# Altium footprint library Pcb-hionyPcbLib.PcbLib: 580 footprints (part 4 of 37)
Each footprint in its own frame and in the unit in brackets; x right, y up, seen from the top. Pads: shape width x height; smd on the part's side, far side on the other; paste and mask are expansions set on the pad; w line width, h text height; cw(c..) or ccw(c..) is an arc to the next point about the centre after c.
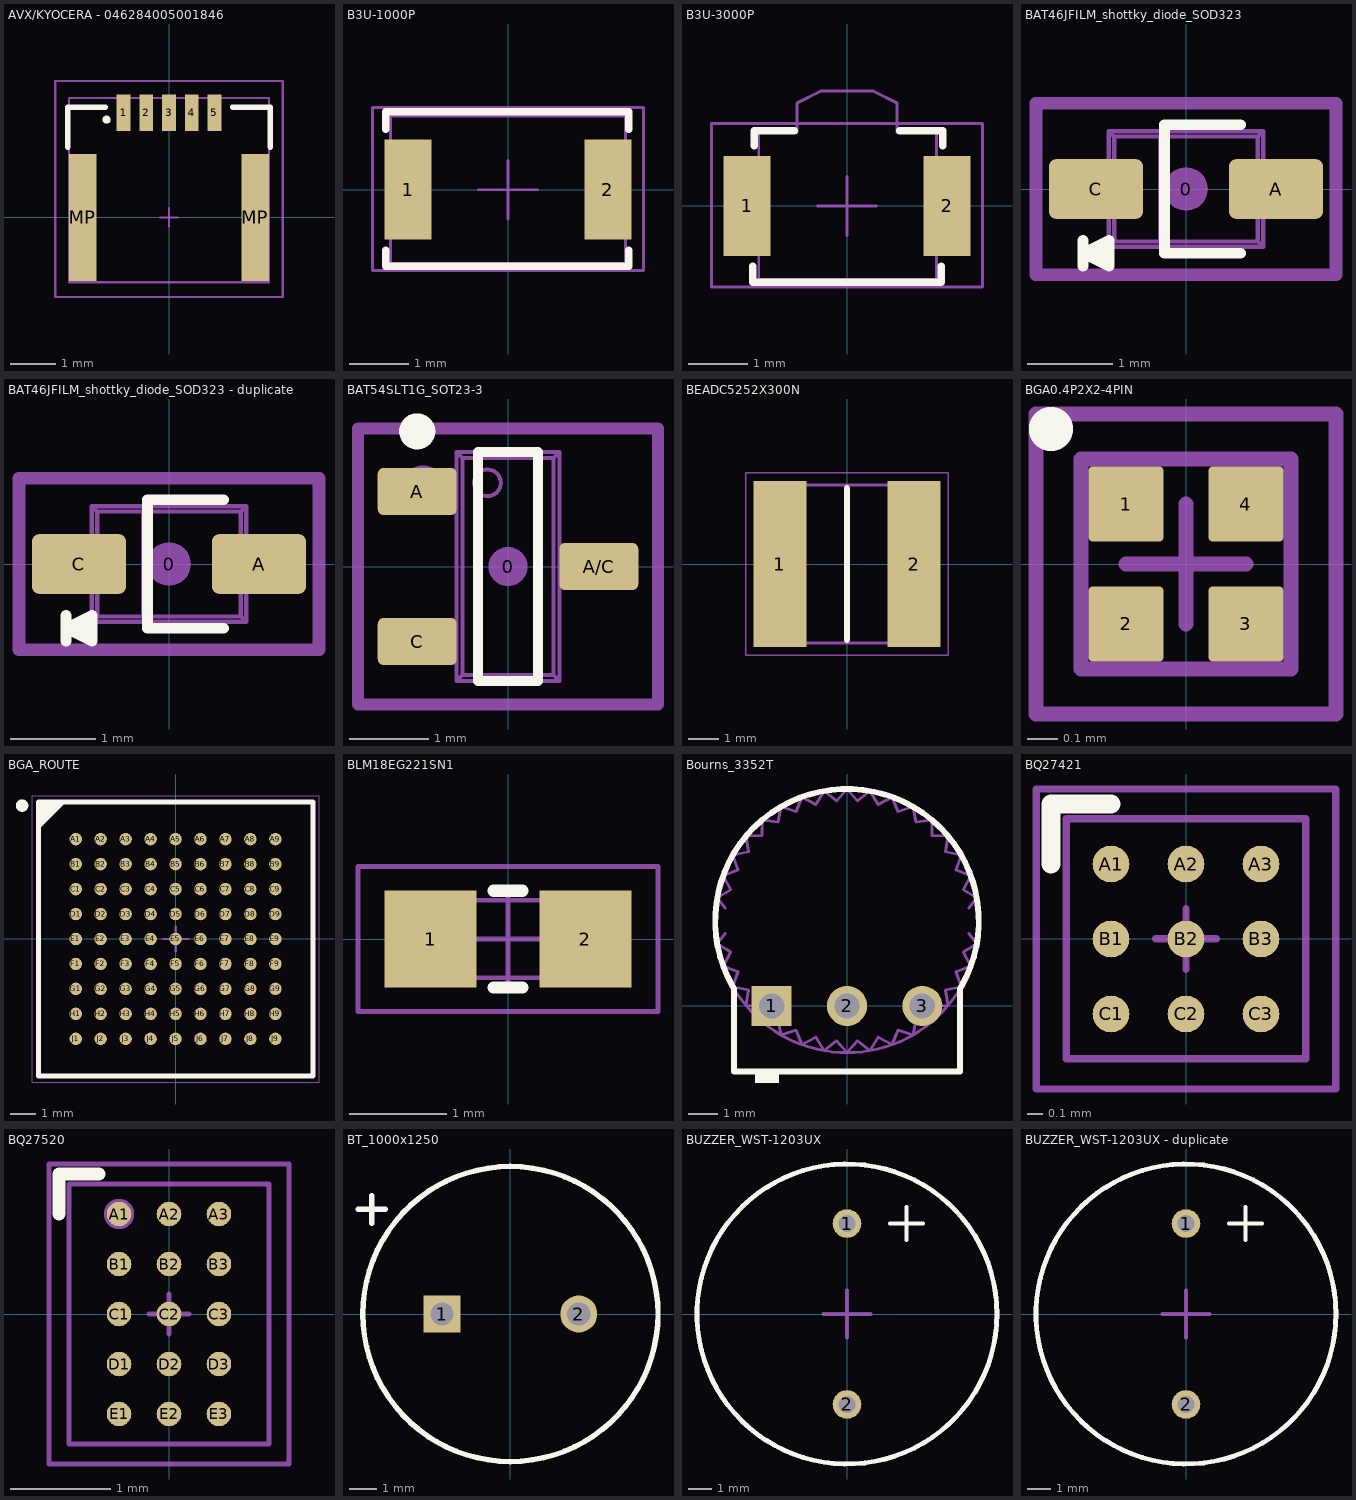
[diagram p3: the footprints below, top view; thin cyan lines are the x and y axes]

## AVX/KYOCERA - 046284005001846 [mm]
pads (7):
  rect 0.3x0.8 smd mask+0.05: 1(-1,2.3) 2(-0.5,2.3) 3(0,2.3) 4(0.5,2.3) 5(1,2.3)
  rect 0.6x2.8 smd mask+0.05: MP(-1.9,0) MP(1.9,0)
Top Overlay:
  circle w0.127: c-1.375,2.15 r0.025
  lines w0.127: -2.225,1.55 -2.225,2.425 -1.4,2.425 ; 1.4,2.425 2.225,2.425 2.225,1.55
Mechanical 11:
  text ".Designator" at -0.5,0 h0.25
Mechanical 13:
  circle w0.1: c-0.991,2.286 r0.025
  lines w0.05: -2.2,-1.425 -2.2,2.625 2.2,2.625 2.2,-1.425 -2.2,-1.425
Mechanical 15:
  lines w0.05: -0.2,0 0.2,0 ; 0,-0.2 0,0.2 ; -2.5,-1.75 2.5,-1.75 2.5,3 -2.5,3 -2.5,-1.75
3D body "006284005001.stp": height 1.51, standoff 0.01, extent -2.2,-1.422 2.2,2.628

## B3U-1000P [mm]
pads (2):
  rect 0.8x1.7 smd: 1(-1.7,0) 2(1.7,0)
Top Overlay:
  lines w0.127: -2.075,-1.025 -2.075,-1.3 2.05,-1.3 2.05,-1.025 ; -2.075,1.025 -2.075,1.325 1.25,1.325 ; 0.9,1.325 2.05,1.325 2.05,1.025
Mechanical 11:
  text ".Designator" at -0.85,-0.425 h0.5
Mechanical 13:
  lines w0.05: -0.85,1.25 0.85,1.25 2,1.25 2,-1.25 -2,-1.25 -2,1.25 -0.85,1.25 ; -0.85,1.25 -0.85,1.25
Mechanical 15:
  lines w0.05: -0.5,0 0.5,0 ; 0,-0.5 0,0.5 ; -2.3,-1.375 2.3,-1.375 2.3,1.4 -2.3,1.4 -2.3,-1.375
3D body "B3U_1000P[].step": height 1.6, standoff 0, extent -2,-1.25 2,1.25

## B3U-3000P [mm]
pads (2):
  rect 0.8x1.7 smd: 1(-1.7,0) 2(1.7,0)
Top Overlay:
  lines w0.127: -1.6,-1.025 -1.6,-1.3 1.6,-1.3 1.6,-1.025 ; -1.575,1.025 -1.575,1.275 -0.9,1.275 ; 0.9,1.275 1.625,1.275 1.625,1.025
Mechanical 11:
  text ".Designator" at 0.975,0.35 h0.5
Mechanical 13:
  lines w0.05: -1.5,-1.25 -1.5,1.25 -0.85,1.25 -0.85,1.75 -0.45,1.95 0.45,1.95 0.85,1.75 0.85,1.25 1.525,1.25 1.525,-1.25 -1.5,-1.25
Mechanical 15:
  lines w0.05: -0.5,0 0.5,0 ; 0,-0.5 0,0.5 ; -2.3,-1.375 2.3,-1.375 2.3,1.4 -2.3,1.4 -2.3,-1.375
3D body: height 1.2, standoff 0.1, extent -0.85,1.25 0.85,1.95
3D body: height 1.35, standoff 0, extent -1.5,-1.25 1.5,1.25

## BAT46JFILM_shottky_diode_SOD323 [mm]
pads (3):
  round 0.508 on Mech15: 0(0,0)
  rrect25% 1.1x0.7 smd: A(1.05,0) C(-1.05,0)
Top Overlay:
  lines w0.127: -1.2,-0.9 -1.2,-0.6 ; -0.9,-0.75 -1.2,-0.75 ; 0.635,-0.75 -0.25,-0.75 -0.25,0.75 0.635,0.75 ; -1.2,-0.75 -0.9,-0.6 -0.9,-0.9 -1.2,-0.75
Mechanical 13:
  lines w0.05: -1.157,-0.2 -1.157,0.2 ; -1.11,-0.2 -1.11,0.2 ; -0.91,-0.2 -0.91,0.2 ; -0.9,-0.2 -0.9,-0.675 ; -0.9,0.2 -0.9,0.675 ; 0.9,-0.2 0.9,-0.675 ; 0.9,0.2 0.9,0.675 ; 0.91,-0.2 0.91,0.2 ; 1.11,-0.2 1.11,0.2 ; 1.157,-0.2 1.157,0.2 ; -0.9,-0.675 0.9,-0.675 ; -0.9,-0.675 -0.838,-0.613 ; -0.9,0.675 -0.838,0.613 ; -0.9,0.675 0.9,0.675 ; -0.838,-0.613 -0.3,-0.613 ; -0.838,-0.613 -0.838,0.613 ; -0.838,0.613 -0.3,0.613 ; -0.3,-0.613 0.838,-0.613 ; -0.3,-0.613 -0.3,0.613 ; -0.3,0.613 0.838,0.613 ; 0.838,-0.613 0.9,-0.675 ; 0.838,-0.613 0.838,0.613 ; 0.838,0.613 0.9,0.675 ; -1.3,-0.2 -0.879,-0.2 -0.879,0.2 -1.3,0.2 -1.3,-0.2 ; 0.879,-0.2 0.879,0.2 1.3,0.2 1.3,-0.2 0.879,-0.2
Mechanical 15:
  lines w0.15: -1.75,-1 1.75,-1 1.75,1 -1.75,1 -1.75,-1
  text "C" at -1.425,-0.25 h0.55
  text "A" at 0.55,-0.225 h0.55
  text ".Designator" at -0.45,-0.825 h0.55
3D body "SOD323.STEP": height 1.1, standoff 0, extent -1.3,-0.675 1.3,0.675

## BAT46JFILM_shottky_diode_SOD323 - duplicate [mm]
pads (3):
  round 0.508 on Mech15: 0(0,0)
  rrect25% 1.1x0.7 smd: A(1.05,0) C(-1.05,0)
Top Overlay:
  lines w0.127: -1.2,-0.9 -1.2,-0.6 ; -0.9,-0.75 -1.2,-0.75 ; 0.635,-0.75 -0.25,-0.75 -0.25,0.75 0.635,0.75 ; -1.2,-0.75 -0.9,-0.6 -0.9,-0.9 -1.2,-0.75
Mechanical 13:
  lines w0.05: -1.157,-0.2 -1.157,0.2 ; -1.11,-0.2 -1.11,0.2 ; -0.91,-0.2 -0.91,0.2 ; -0.9,-0.2 -0.9,-0.675 ; -0.9,0.2 -0.9,0.675 ; 0.9,-0.2 0.9,-0.675 ; 0.9,0.2 0.9,0.675 ; 0.91,-0.2 0.91,0.2 ; 1.11,-0.2 1.11,0.2 ; 1.157,-0.2 1.157,0.2 ; -0.9,-0.675 0.9,-0.675 ; -0.9,-0.675 -0.838,-0.613 ; -0.9,0.675 -0.838,0.613 ; -0.9,0.675 0.9,0.675 ; -0.838,-0.613 -0.3,-0.613 ; -0.838,-0.613 -0.838,0.613 ; -0.838,0.613 -0.3,0.613 ; -0.3,-0.613 0.838,-0.613 ; -0.3,-0.613 -0.3,0.613 ; -0.3,0.613 0.838,0.613 ; 0.838,-0.613 0.9,-0.675 ; 0.838,-0.613 0.838,0.613 ; 0.838,0.613 0.9,0.675 ; -1.3,-0.2 -0.879,-0.2 -0.879,0.2 -1.3,0.2 -1.3,-0.2 ; 0.879,-0.2 0.879,0.2 1.3,0.2 1.3,-0.2 0.879,-0.2
Mechanical 15:
  lines w0.15: -1.75,-1 1.75,-1 1.75,1 -1.75,1 -1.75,-1
  text "C" at -1.425,-0.25 h0.55
  text "A" at 0.55,-0.225 h0.55
  text ".Designator" at -0.45,-0.825 h0.55
3D body "SOD323.STEP": height 1.1, standoff 0, extent -1.3,-0.675 1.3,0.675

## BAT54SLT1G_SOT23-3 [mm]
pads (4):
  round 0.5 on Mech15: 0(0,0)
  rrect25% 1x0.6 smd: A(-1.15,0.95) A/C(1.15,0) C(-1.15,-0.95)
Top Overlay:
  circle w0.254: c-1.15,1.712 r0.102
  lines w0.127: -0.381,-1.45 -0.381,1.45 0.381,1.45 0.381,-1.45 -0.381,-1.45
Mechanical 13:
  circle w0.05: c-0.26,1.06 r0.169
  lines w0.05: -1.19,-1.19 -1.19,-0.71 ; -1.19,0.71 -1.19,1.19 ; -1.099,-1.19 -1.099,-0.71 ; -1.099,0.71 -1.099,1.19 ; -1.074,-1.19 -1.074,-0.71 ; -1.074,0.71 -1.074,1.19 ; -0.825,-1.19 -0.825,-0.71 ; -0.825,0.71 -0.825,1.19 ; -0.65,-1.19 -1.4,-1.19 -1.4,-0.71 -0.65,-0.71 ; -0.65,0.71 -1.4,0.71 -1.4,1.19 -0.65,1.19 ; 0.65,-0.24 1.4,-0.24 1.4,0.24 0.65,0.24 ; 0.825,-0.24 0.825,0.24 ; 1.074,-0.24 1.074,0.24 ; 1.099,-0.24 1.099,0.24 ; 1.19,-0.24 1.19,0.24 ; -0.65,-1.45 0.65,-1.45 ; -0.65,-1.45 -0.65,1.45 ; -0.65,-1.45 -0.576,-1.376 ; -0.65,1.45 -0.576,1.376 ; -0.65,1.45 0.65,1.45 ; -0.576,-1.376 0.576,-1.376 ; -0.576,-1.376 -0.576,1.376 ; -0.576,1.376 0.576,1.376 ; 0.576,-1.376 0.65,-1.45 ; 0.576,-1.376 0.576,1.376 ; 0.576,1.376 0.65,1.45 ; 0.65,-1.45 0.65,1.45
Mechanical 15:
  circle w0.35: c-1.073,0.975 r0.127
  lines w0.15: -1.9,-1.75 -1.9,1.75 1.9,1.75 1.9,-1.75 -1.9,-1.75
  text ".Designator" at -1.125,0.45 h0.55
3D body "SOT23-3.STEP": height 1.29, standoff -0.01, extent -1.4,-1.45 1.4,1.45

## BEADC5252X300N [mm]
pads (2):
  rect 1.75x5.45 smd: 1(-2.2,0) 2(2.2,0)
Top Overlay:
  lines w0.2: 0,-2.49 0,2.49
Mechanical 13:
  lines w0.1: -2.59,-2.59 -2.59,2.59 2.59,2.59 2.59,-2.59 -2.59,-2.59
Mechanical 15:
  lines w0.05: -3.325,-3 -3.325,3 3.325,3 3.325,-3 -3.325,-3
3D body "IHLP2020CZER2R2M11.stp": height 2.86, standoff 0, extent -2.721,-2.571 2.73,2.575

## BGA0.4P2X2-4PIN [mm]
pads (4):
  rrect10% 0.25x0.25 smd paste-10 mask+0.036: 1(-0.2,0.2) 2(-0.2,-0.2) 3(0.2,-0.2) 4(0.2,0.2)
Top Overlay:
  circle w0.127: c-0.45,0.45 r0.01
Top Paste:
  circle w0.125: c0.2,0.2 r0.062
  circle w0.125: c0.2,-0.2 r0.062
  circle w0.125: c-0.2,-0.2 r0.062
  circle w0.125: c-0.2,0.2 r0.062
Mechanical 11:
  text ".Designator" at -0.325,-0.3 h0.25
Mechanical 13:
  circle w0.1: c-0.2,0.2 r0.01
  lines w0.05: -0.35,-0.35 -0.35,0.35 0.35,0.35 0.35,-0.35 -0.35,-0.35
Mechanical 15:
  lines w0.05: -0.2,0 0.2,0 ; 0,-0.2 0,0.2 ; -0.5,-0.5 -0.5,0.5 0.5,0.5 0.5,-0.5 -0.5,-0.5
3D body: height 0.17, standoff -0.05, extent 0.091,0.091 0.31,0.31
3D body: height 0.17, standoff -0.05, extent -0.309,0.091 -0.09,0.31
3D body: height 0.17, standoff -0.05, extent -0.309,-0.309 -0.09,-0.09
3D body: height 0.17, standoff -0.05, extent 0.091,-0.309 0.31,-0.09
3D body: height 0.32, standoff 0.05, extent -0.35,-0.35 0.35,0.35
3D body: height 0.34, standoff 0.33, extent -0.3,0.1 -0.101,0.3

## BGA_ROUTE [mm] "BGA, 81-Leads, Body 11.00x11.00mmx3.50mm, Pitch 1.00mm"
height 3.5
pads (81):
  round 0.5 smd: A1(-4,4) A2(-3,4) A3(-2,4) A4(-1,4) A5(0,4) A6(1,4) A7(2,4) A8(3,4) A9(4,4) B1(-4,3) B2(-3,3) B3(-2,3) B4(-1,3) B5(0,3) B6(1,3) B7(2,3) B8(3,3) B9(4,3) C1(-4,2) C2(-3,2) C3(-2,2) C4(-1,2) C5(0,2) C6(1,2) C7(2,2) C8(3,2) C9(4,2) D1(-4,1) D2(-3,1) D3(-2,1) D4(-1,1) D5(0,1) D6(1,1) D7(2,1) D8(3,1) D9(4,1) E1(-4,0) E2(-3,0) E3(-2,0) E4(-1,0) E5(0,0) E6(1,0) E7(2,0) E8(3,0) E9(4,0) F1(-4,-1) F2(-3,-1) F3(-2,-1) F4(-1,-1) F5(0,-1) F6(1,-1) F7(2,-1) F8(3,-1) F9(4,-1) G1(-4,-2) G2(-3,-2) G3(-2,-2) G4(-1,-2) G5(0,-2) G6(1,-2) G7(2,-2) G8(3,-2) G9(4,-2) H1(-4,-3) H2(-3,-3) H3(-2,-3) H4(-1,-3) H5(0,-3) H6(1,-3) H7(2,-3) H8(3,-3) H9(4,-3) J1(-4,-4) J2(-3,-4) J3(-2,-4) J4(-1,-4) J5(0,-4) J6(1,-4) J7(2,-4) J8(3,-4) J9(4,-4)
Top Overlay:
  circle w0.25: c-6.15,5.35 r0.125
  region: -4.5,5.5 -5.5,4.5 -5.5,5.5
  lines w0.2: -5.5,4.5 -4.5,5.5 ; -5.5,-5.5 5.5,-5.5 5.5,5.5 -5.5,5.5 -5.5,-5.5
Top Courtyard:
  lines w0.05: -5.75,-5.75 5.75,-5.75 5.75,5.75 -5.75,5.75 -5.75,-5.75
  lines w0.1: -0.5,0 0.5,0 ; 0,-0.5 0,0.5
Top Assembly:
  lines w0.1: -5.5,-5.5 5.5,-5.5 5.5,5.5 -5.5,5.5 -5.5,-5.5
3D body: height 3.5, standoff 0.3, extent -5.5,-5.5 5.5,5.5

## BLM18EG221SN1 [mm]
pads (2):
  rect 0.95x1 smd: 1(-0.8,0) 2(0.8,0)
Top Overlay:
  lines w0.127: -0.15,-0.5 0.15,-0.5 ; -0.15,0.5 0.15,0.5
Mechanical 11:
  text ".Designator" at -1.3,-0.425 h0.5
Mechanical 13:
  lines w0.05: -0.8,-0.4 -0.8,0.4 0.8,0.4 0.8,-0.4 -0.8,-0.4
Mechanical 15:
  lines w0.05: -0.5,0 0.5,0 ; 0,-0.5 0,0.5 ; -1.55,-0.75 -1.55,0.75 1.55,0.75 1.55,-0.75 -1.55,-0.75
3D body "BLM18EG221SN1.STEP": height 0.8, standoff 0, extent -0.8,-0.4 0.8,0.4

## Bourns_3352T [mm]
pads (3):
  rect 1.35x1.35 hole 0.85: 1(-2.54,0)
  round 1.35 hole 0.85: 2(0,0) 3(2.54,0)
Top Overlay:
  region: -2.3,-2.6 -2.3,-2.2 -3.1,-2.2 -3.1,-2.6
  lines w0.2: -3.849,0.647 cw(c0,2.87) 3.849,0.647 ; -3.81,0.58 -3.81,-2.21 3.81,-2.21 3.81,0.58
Top 3D Body:
  lines w0.1: -4.105,2.44 -4.377,2.098 ; -4.105,3.3 -4.377,3.642 ; -3.81,0.58 -3.81,-2.21 3.81,-2.21 3.81,0.58 ; 4.105,2.44 4.377,2.098 ; 4.105,3.3 4.377,3.642 ; -4.377,2.098 cw(c0,2.87) -4.377,3.642 ; -4.377,2.098 ccw(c0,2.87) -4.177,1.35 ; -4.377,2.098 -3.922,1.819 -4.177,1.35 ; -4.377,3.642 cw(c0,2.87) -4.177,4.39 ; -4.377,3.642 -3.922,3.921 -4.177,4.39 ; -4.177,1.35 ccw(c0,2.87) -3.849,0.647 ; -4.177,1.35 -3.68,1.154 -3.849,0.647 ; -4.177,4.39 cw(c0,2.87) -3.849,5.093 ; -4.177,4.39 -3.68,4.586 -3.849,5.092 ; -3.849,0.647 ccw(c0,2.87) -3.405,0.013 ; -3.849,0.647 -3.326,0.541 -3.405,0.013 ; -3.849,5.093 cw(c0,2.87) -3.405,5.727 ; -3.849,5.092 -3.326,5.199 -3.405,5.727 ; -3.405,0.013 ccw(c0,2.87) -2.857,-0.535 ; -3.405,0.013 -2.871,-0.001 -2.857,-0.535 ; -3.405,5.727 cw(c0,2.87) -2.857,6.275 ; -3.405,5.727 -2.871,5.741 -2.857,6.275 ; -2.857,-0.535 ccw(c0,2.87) -2.223,-0.979 ; -2.857,-0.535 -2.329,-0.456 -2.222,-0.979 ; -2.857,6.275 cw(c0,2.87) -2.223,6.719 ; -2.857,6.275 -2.329,6.196 -2.222,6.719 ; -2.223,-0.979 ccw(c0,2.87) -1.52,-1.307 ; -2.222,-0.979 -1.716,-0.81 -1.52,-1.307 ; -2.223,6.719 cw(c0,2.87) -1.52,7.047 ; -2.222,6.719 -1.716,6.55 -1.52,7.047 ; -1.52,-1.307 ccw(c0,2.87) -0.772,-1.507 ; -1.52,-1.307 -1.051,-1.052 -0.772,-1.507 ; -1.52,7.047 cw(c0,2.87) -0.772,7.247 ; -1.52,7.047 -1.051,6.792 -0.772,7.247 ; -0.772,-1.507 ccw(c0,2.87) 0,-1.575 ; -0.772,-1.507 -0.354,-1.175 0,-1.575 ; -0.772,7.247 cw(c0,2.87) 0,7.315 ; -0.772,7.247 -0.354,6.915 0,7.315 ; 0,-1.575 ccw(c0,2.87) 0.772,-1.507 ; 0,-1.575 0.354,-1.175 0.772,-1.507 ; 0,7.315 cw(c0,2.87) 0.772,7.247 ; 0,7.315 0.354,6.915 0.772,7.247 ; 0.772,-1.507 ccw(c0,2.87) 1.52,-1.307 ; 0.772,-1.507 1.051,-1.052 1.52,-1.307 ; 0.772,7.247 cw(c0,2.87) 1.52,7.047 ; 0.772,7.247 1.051,6.792 1.52,7.047 ; 1.52,-1.307 ccw(c0,2.87) 2.223,-0.979 ; 1.52,-1.307 1.716,-0.81 2.222,-0.979 ; 1.52,7.047 cw(c0,2.87) 2.223,6.719 ; 1.52,7.047 1.716,6.55 2.222,6.719 ; 2.223,-0.979 ccw(c0,2.87) 2.857,-0.535 ; 2.222,-0.979 2.329,-0.456 2.857,-0.535 ; 2.223,6.719 cw(c0,2.87) 2.857,6.275 ; 2.222,6.719 2.329,6.196 2.857,6.275 ; 2.857,-0.535 ccw(c0,2.87) 3.405,0.013 ; 2.857,-0.535 2.871,-0.001 3.405,0.013 ; 2.857,6.275 cw(c0,2.87) 3.405,5.727 ; 2.857,6.275 2.871,5.741 3.405,5.727 ; 3.405,0.013 ccw(c0,2.87) 3.849,0.647 ; 3.405,0.013 3.326,0.541 3.849,0.647 ; 3.405,5.727 cw(c0,2.87) 3.849,5.093 ; 3.405,5.727 3.326,5.199 3.849,5.092 ; 3.849,0.647 ccw(c0,2.87) 4.177,1.35 ; 3.849,0.647 3.68,1.154 4.177,1.35 ; 3.849,5.093 cw(c0,2.87) 4.177,4.39 ; 3.849,5.092 3.68,4.586 4.177,4.39 ; 4.177,1.35 ccw(c0,2.87) 4.377,2.098 ; 4.177,1.35 3.922,1.819 4.377,2.098 ; 4.177,4.39 cw(c0,2.87) 4.377,3.642 ; 4.177,4.39 3.922,3.921 4.377,3.642 ; 4.377,2.098 ccw(c0,2.87) 4.377,3.642
  text ".Designator" at -2,2 h1.02
3D body "3352T.stp": height 3.81, standoff -4.75, extent -4.445,-2.21 4.445,7.315

## BQ27421 [mm]
pads (9):
  round 0.245 smd paste-10 mask+0.05: A1(-0.5,0.5) A2(0,0.5) A3(0.5,0.5) B1(-0.5,0) B2(0,0) B3(0.5,0) C1(-0.5,-0.5) C2(0,-0.5) C3(0.5,-0.5)
Top Overlay:
  lines w0.127: -0.9,0.5 -0.9,0.9 -0.5,0.9
Top Paste:
  drawing of 9 lines, arcs and shapes, not listed
Mechanical 11:
  text ".Designator" at -0.5,-0.1 h0.25
Mechanical 13:
  circle w0.1: c-0.5,0.5 r0.01
  lines w0.05: -0.8,-0.8 0.8,-0.8 0.8,0.8 -0.8,0.8 -0.8,-0.8
Mechanical 15:
  lines w0.05: -0.2,0 0.2,0 ; 0,-0.2 0,0.2 ; -1,-1 -1,1 1,1 1,-1 -1,-1
3D body: height 0.25, standoff -0.05, extent 0.359,-0.148 0.65,0.148
3D body: height 0.25, standoff -0.05, extent -0.141,-0.648 0.15,-0.352
3D body: height 0.25, standoff -0.05, extent 0.359,-0.648 0.65,-0.352
3D body: height 0.25, standoff -0.05, extent -0.641,-0.648 -0.35,-0.352
3D body: height 0.25, standoff -0.05, extent -0.141,-0.148 0.15,0.148
3D body: height 0.25, standoff -0.05, extent 0.359,0.352 0.65,0.648
3D body: height 0.25, standoff -0.05, extent -0.141,0.352 0.15,0.648
3D body: height 0.25, standoff -0.05, extent -0.641,0.352 -0.35,0.648
3D body: height 0.25, standoff -0.05, extent -0.641,-0.148 -0.35,0.148
3D body: height 0.63, standoff 0.2, extent -0.8,-0.8 0.8,0.8
3D body: height 0.63, standoff 0.63, extent -0.7,0.5 -0.5,0.7

## BQ27520 [mm]
pads (15):
  round 0.245 smd paste-10 mask+0.05: A1(-0.5,1) A2(0,1) A3(0.5,1) B1(-0.5,0.5) B2(0,0.5) B3(0.5,0.5) C1(-0.5,0) C2(0,0) C3(0.5,0) D1(-0.5,-0.5) D2(0,-0.5) D3(0.5,-0.5) E1(-0.5,-1) E2(0,-1) E3(0.5,-1)
Top Overlay:
  lines w0.127: -1.1,1 -1.1,1.4 -0.7,1.4
Top Paste:
  drawing of 15 lines, arcs and shapes, not listed
Mechanical 11:
  text ".Designator" at -0.5,0 h0.25
Mechanical 13:
  circle w0.254: c-0.5,1 r0.025
  lines w0.05: -1,-1.3 -1,1.3 1,1.3 1,-1.3 -1,-1.3
Mechanical 15:
  lines w0.05: -0.2,0 0.2,0 ; 0,-0.2 0,0.2 ; -1.2,-1.5 1.2,-1.5 1.2,1.5 -1.2,1.5 -1.2,-1.5
3D body: height 0.25, standoff -0.05, extent -0.641,-1.148 -0.35,-0.852
3D body: height 0.25, standoff -0.05, extent -0.141,-1.148 0.15,-0.852
3D body: height 0.25, standoff -0.05, extent 0.359,-1.148 0.65,-0.852
3D body: height 0.25, standoff -0.05, extent -0.641,-0.648 -0.35,-0.352
3D body: height 0.25, standoff -0.05, extent -0.141,-0.648 0.15,-0.352
3D body: height 0.25, standoff -0.05, extent 0.359,-0.648 0.65,-0.352
3D body: height 0.63, standoff 0.63, extent -0.9,1 -0.7,1.2
3D body: height 0.63, standoff 0.2, extent -1,-1.3 1,1.3
3D body: height 0.25, standoff -0.05, extent -0.641,0.352 -0.35,0.648
3D body: height 0.25, standoff -0.05, extent -0.641,0.852 -0.35,1.148
3D body: height 0.25, standoff -0.05, extent -0.141,0.852 0.15,1.148
3D body: height 0.25, standoff -0.05, extent 0.359,0.852 0.65,1.148
3D body: height 0.25, standoff -0.05, extent -0.141,0.352 0.15,0.648
3D body: height 0.25, standoff -0.05, extent -0.641,-0.148 -0.35,0.148
3D body: height 0.25, standoff -0.05, extent 0.359,-0.148 0.65,0.148
3D body: height 0.25, standoff -0.05, extent -0.141,-0.148 0.15,0.148
3D body: height 0.25, standoff -0.05, extent 0.359,0.352 0.65,0.648

## BT_1000x1250 [mm]
pads (2):
  rect 1.35x1.35 hole 0.85 paste+0: 1(-2.5,0)
  round 1.35 hole 0.85 paste+0: 2(2.5,0)
Top Overlay:
  circle w0.2: c0,0 r5.4
  lines w0.2: -5.578,3.827 -4.576,3.827 ; -5.077,3.326 -5.077,4.328
Top 3D Body:
  circle w0.1: c0,0 r5.4
  rectangle: -3.053,-0.54 -1.971,0.554
  text ".Designator" at -1.7,-0.4 h1.02
3D body "BT_1000x1250.stp": height 14.51, standoff -4, extent -5.358,-5.391 5.39,5.391

## BUZZER_WST-1203UX [mm]
pads (2):
  round 1.2 hole 0.7 mask+0.05: 1(0,3.8) 2(0,-3.8)
Top Overlay:
  circle w0.2: c0,0 r6.3
  lines w0.15: 1.8,3.8 3.2,3.8 ; 2.5,3.1 2.5,4.5
Mechanical 15:
  circle w0.2: c0,0 r6.301
  lines w0.15: -1,0 0,0 ; 0,-1 0,0 ; 0,1 0,0 ; 1,0 0,0
  text "positive (longer pin)" at -1.5,-5.175 h0.55
  text ".Designator" at 2.1,-0.45 h0.55
3D body "User Library-WST-1203UX.step": height 9.65, standoff -4.5, extent -6,-6.027 6,9.427

## BUZZER_WST-1203UX - duplicate [mm]
pads (2):
  round 1.2 hole 0.7 mask+0.05: 1(0,3.8) 2(0,-3.8)
Top Overlay:
  circle w0.2: c0,0 r6.3
  lines w0.15: 1.8,3.8 3.2,3.8 ; 2.5,3.1 2.5,4.5
Mechanical 15:
  circle w0.2: c0,0 r6.301
  lines w0.15: -1,0 0,0 ; 0,-1 0,0 ; 0,1 0,0 ; 1,0 0,0
  text ".Designator" at 2.1,-0.45 h0.55
  text "positive (longer pin)" at -1.5,-5.175 h0.55
3D body "User Library-WST-1203UX.step": height 9.65, standoff -4.5, extent -6,-6.027 6,9.427